# Altium footprint library MinervaBots.PcbLib: 162 footprints (part 8 of 11)
Each footprint in its own frame and in the unit in brackets; x right, y up, seen from the top. Pads: shape width x height; smd on the part's side, far side on the other; paste and mask are expansions set on the pad; w line width, h text height; cw(c..) or ccw(c..) is an arc to the next point about the centre after c.
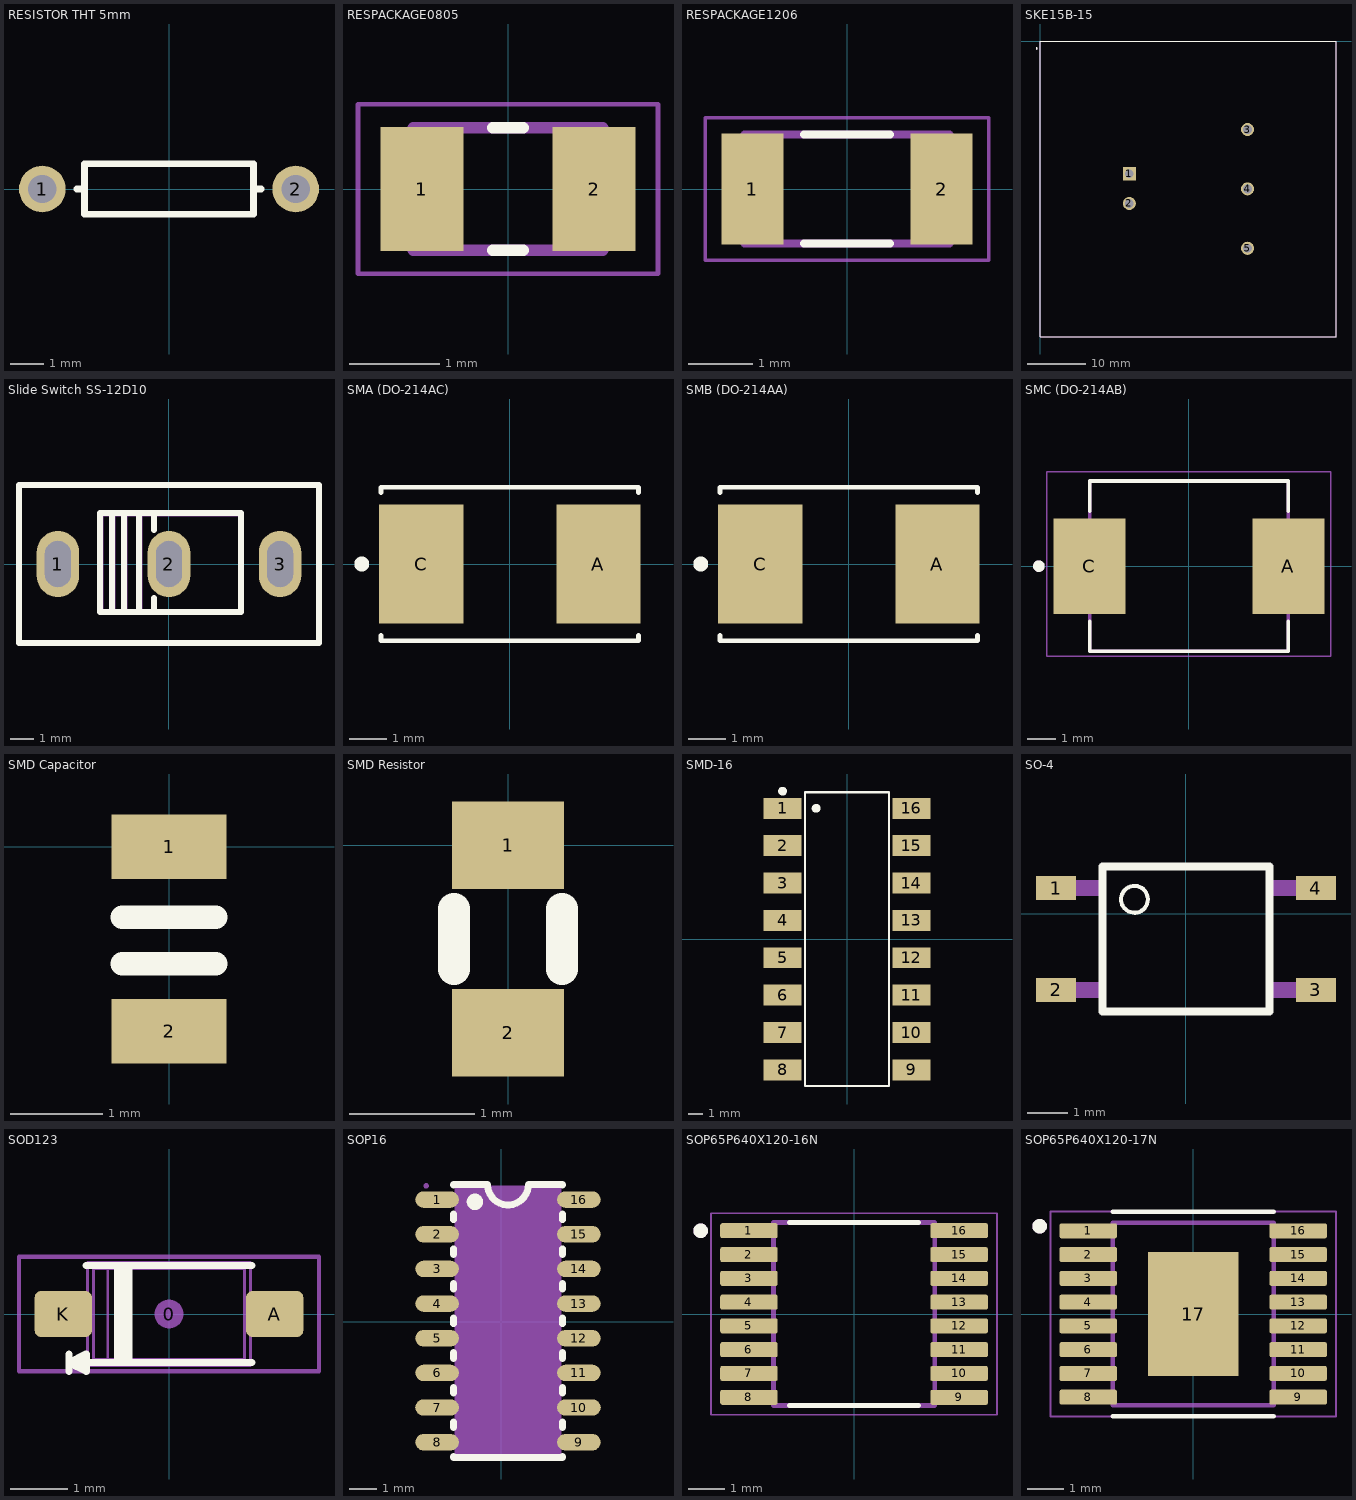
[diagram p7: the footprints below, top view; thin cyan lines are the x and y axes]

## RESISTOR THT 5mm [mm]
pads (2):
  round 1.4 hole 0.85: 1(-3.81,0) 2(3.81,0)
Top Overlay:
  lines w0.2: -2.769,0 -2.54,0 ; 2.769,0 2.54,0 ; 2.54,0 2.54,-0.762 -2.54,-0.762 -2.54,0.762 2.54,0.762 2.54,0
Top Designator:
  text ".Designator" at -7.618,-0.458 h1.52
3D body "Resistor 0.0125W 3mm.step": height 2.55, standoff -6, extent -4.07,-1 4.07,1.1

## RESPACKAGE0805 [mm]
pads (2):
  rect 0.92x1.38 smd: 1(-0.955,0) 2(0.955,0)
Top Overlay:
  lines w0.127: -0.17,-0.68 0.17,-0.68 ; -0.17,0.68 0.17,0.68
Top Designator:
  text ".Designator" at -7.618,-0.508 h1.52
Mechanical 13:
  lines w0.127: -1.05,-0.68 1.05,-0.68 1.05,0.68 -1.05,0.68 -1.05,-0.68
Mechanical 15:
  lines w0.05: -1.665,-0.94 1.665,-0.94 1.665,0.94 -1.665,0.94 -1.665,-0.94
3D body "1623119-1.STEP": height 0.6, standoff 0, extent -1,-0.625 1,0.625

## RESPACKAGE1206 [mm]
pads (2):
  rect 0.97x1.73 smd: 1(-1.48,0) 2(1.48,0)
Top Overlay:
  lines w0.127: -0.67,-0.85 0.67,-0.85 ; -0.67,0.85 0.67,0.85
Top Designator:
  text ".Designator" at -7.618,-0.508 h1.52
Mechanical 13:
  lines w0.127: -1.6,-0.85 -1.6,0.85 1.6,0.85 1.6,-0.85 -1.6,-0.85
Mechanical 15:
  lines w0.05: -2.215,-1.115 -2.215,1.115 2.215,1.115 2.215,-1.115 -2.215,-1.115

## SKE15B-15 [mm]
pads (5):
  rect 2.25x2.25 hole 1.5: 1(15.3,-22.8)
  round 2.25 hole 1.5: 2(15.3,-27.9) 3(35.6,-15.2) 4(35.6,-25.4) 5(35.6,-35.6)
Top Overlay:
  circle w0.2: c-0.635,-1.27 r0.1
  lines w0.127: 0,-50.8 50.8,-50.8 50.8,0 0,0 0,-50.8
Top Designator:
  text ".Designator" at 17.397,-25.924 h1.52
Mechanical 4:
  circle w0.2: c-0.635,-1.27 r0.1
  lines w0.127: 0,-50.831 0,0 50.8,0 50.8,-50.8 0,-50.8
Mechanical 16:
  lines w0.05: 0,-50.8 50.8,-50.8 50.8,0 0,0 0,-50.8
3D body: height 11, standoff 0, extent 0,-50.8 50.8,0

## Slide Switch SS-12D10 [mm]
pads (3):
  oval 1.8x2.8 hole 1.1 slot 1.95 at 90 deg: 1(-4.7,0) 2(0,0) 3(4.7,0)
Top Overlay:
  lines w0.254: -2.413,-1.905 -2.413,2.159 -2.286,2.159 ; -1.905,-2.032 -1.905,2.159 ; -1.397,2.159 -1.27,2.159 -1.27,-2.032 ; -0.762,2.159 -0.635,2.159 -0.635,1.436 ; -0.635,-2.025 -0.635,-1.436 ; -6.35,-3.35 -6.35,3.35 6.35,3.35 6.35,-3.35 -6.35,-3.35 ; -2.921,-2.032 -2.921,2.159 3.048,2.159 3.048,-2.032 -2.921,-2.032
Top Designator:
  text ".Designator" at -7.618,4.667 h1.52
Mechanical 15:
  region: -1.397,2.032 -1.143,2.032 -1.143,-1.905 -1.397,-1.905
  region: -2.032,2.032 -1.778,2.032 -1.778,-2.032 -2.032,-2.032 -2.032,-1.905
  region: -2.54,2.032 -2.286,2.032 -2.286,-1.905 -2.54,-1.905 -2.54,-1.778
  region: -2.921,2.159 -2.794,2.159 -2.794,-1.905 -2.921,-1.905
  region: -2.921,2.159 3.048,2.159 3.048,-2.032 -2.921,-2.032 -2.921,-1.905 2.921,-1.905 2.921,2.032 -2.921,2.032
3D body "ss-12d10l6.stp": height 12.4, standoff -6.9, extent -6.5,-3.4 6.5,3.4

## SMA (DO-214AC) [mm] "Diodo Schottky"
pads (2):
  rect 2.25x3.18 smd: A(2.365,0) C(-2.365,0)
Top Overlay:
  circle w0.2: c-3.95,0 r0.1
  lines w0.127: -3.437,-2.05 -1.719,-2.05 1.719,-2.05 3.437,-2.05 3.437,-1.91 ; -3.437,-2.025 -3.437,-1.91 ; -3.437,1.91 -3.437,2.05 -1.719,2.05 1.719,2.05 3.437,2.05 ; 3.437,1.91 3.437,2.025
Top Designator:
  text ".Designator" at -7.897,-0.508 h1.52
3D body "SMA.step": height 2.2, standoff 0, extent -2.598,-1.302 2.598,1.302

## SMB (DO-214AA) [mm] "Diodo Schottky"
pads (2):
  rect 2.25x3.18 smd: A(2.365,0) C(-2.365,0)
Top Overlay:
  circle w0.2: c-3.95,0 r0.1
  lines w0.127: -3.437,-2.05 -1.719,-2.05 1.719,-2.05 3.437,-2.05 3.437,-1.91 ; -3.437,-2.025 -3.437,-1.91 ; -3.437,1.91 -3.437,2.05 -1.719,2.05 1.719,2.05 3.437,2.05 ; 3.437,1.91 3.437,2.025
Top Designator:
  text ".Designator" at -7.897,-0.508 h1.52
3D body "SMB.step": height 2.2, standoff 0, extent -2.648,-1.81 2.648,1.81

## SMC (DO-214AB) [mm] "Diodo Schottky"
pads (2):
  rect 2.5x3.3 smd: A(3.45,0) C(-3.45,0)
Top Overlay:
  circle w0.2: c-5.2,0 r0.1
  lines w0.127: -3.433,-1.91 -3.433,-2.95 3.441,-2.95 3.441,-1.91 ; -3.433,1.91 -3.433,2.95 3.441,2.95 3.441,1.91
Top Designator:
  text ".Designator" at -7.843,-0.433 h1.52
Mechanical 13:
  circle w0.2: c-5.2,0 r0.1
  lines w0.127: -3.433,-2.95 -3.433,2.95 3.441,2.95 3.441,-2.95 -3.433,-2.95
Mechanical 15:
  lines w0.05: -4.925,-3.125 4.925,-3.125 4.925,3.275 -4.925,3.275 -4.925,-3.125
3D body "SS34.STEP": height 2.5, standoff 0, extent -3.95,-2.9 3.95,2.9

## SMD Capacitor [mm]
pads (2):
  rect 1.25x0.7 smd: 1(0,0) 2(0,-2)
Top Overlay:
  lines w0.254: -0.508,-1.27 0.508,-1.27 ; -0.508,-0.762 0.508,-0.762
Top Designator:
  text ".Designator" at -7.618,-1.508 h1.52
3D body "Capacitor SMD 0805.step": height 1, standoff 0, extent -0.625,-1.99 0.625,0.01

## SMD Resistor [mm]
pads (2):
  rect 0.9x0.7 smd: 1(0,0) 2(0,-1.5)
Top Overlay:
  lines w0.254: -0.432,-0.991 -0.432,-0.508 ; 0.432,-0.991 0.432,-0.508
Top Designator:
  text ".Designator" at -7.617,-1.258 h1.52
3D body "SMD Resistor CRS0805.step": height 0.5, standoff 0, extent -0.624,-1.743 0.626,0.257

## SMD-16 [mm]
pads (16):
  rect 2.6x1.422 smd: 1(-4.38,8.89) 2(-4.38,6.35) 3(-4.38,3.81) 4(-4.38,1.27) 5(-4.38,-1.27) 6(-4.38,-3.81) 7(-4.38,-6.35) 8(-4.38,-8.89) 9(4.38,-8.89) 10(4.38,-6.35) 11(4.38,-3.81) 12(4.38,-1.27) 13(4.38,1.27) 14(4.38,3.81) 15(4.38,6.35) 16(4.38,8.89)
Top Overlay:
  circle w0.3: c-4.38,10.054 r0.15
  circle w0.3: c-2.099,8.89 r0.15
  lines w0.152: -2.851,-9.986 -2.851,9.986 2.851,9.986 2.851,-9.986 -2.851,-9.986
Top Designator:
  text ".Designator" at -7.618,-0.362 h1.52
3D body "ILQ32-X009.STEP": height 4.06, standoff 0, extent -4.788,-9.96 4.992,9.96

## SO-4 [mm]
pads (4):
  rect 1x0.6 smd: 1(-3.24,0.635) 2(-3.24,-1.905) 3(3.24,-1.905) 4(3.24,0.635)
Top Overlay:
  circle w0.102: c-1.285,0.354 r0.335
  lines w0.203: -2.085,-2.438 -2.085,1.168 2.085,1.168 2.085,-2.438 -2.085,-2.438
Top Designator:
  text ".Designator" at -7.618,-1.143 h1.52
Mechanical 13:
  region: 3.471,0.445 2.153,0.445 2.153,0.826 3.471,0.826
  region: 3.471,-2.097 2.152,-2.097 2.152,-1.714 3.471,-1.714
  region: -2.15,-2.097 -3.474,-2.097 -3.474,-1.714 -2.15,-1.714
  region: -2.15,0.445 -3.476,0.445 -3.476,0.826 -2.15,0.826

## SOD123 [mm] "SOD-123; 2 Leads; Body 2.7 x 1.6 mm, (LxW)"
height 1.35
pads (3):
  round 0.508 on Mech15: 0(0,0)
  rrect25% 1x0.8 smd: A(1.85,0) K(-1.85,0)
Top Overlay:
  lines w0.127: -1.75,-1 -1.75,-0.7 ; -1.45,0.85 1.45,0.85 ; -0.9,-0.85 -0.9,0.85 ; -0.8,-0.85 -0.8,0.85 ; -0.7,-0.85 -0.7,0.85 ; 1.448,-0.85 -1.45,-0.85 -1.75,-0.85 ; -1.75,-0.85 -1.45,-1 -1.45,-0.7 -1.75,-0.85
Top Designator:
  text ".Designator" at -7.618,-0.521 h1.52
Mechanical 13:
  lines w0.05: -1.766,-0.308 -1.766,0.308 ; -1.707,-0.308 -1.707,0.308 ; -1.517,-0.308 -1.517,0.308 ; -1.425,-0.308 -1.95,-0.308 -1.95,0.308 -1.425,0.308 ; 1.425,-0.308 1.95,-0.308 1.95,0.308 1.425,0.308 ; 1.517,-0.308 1.517,0.308 ; 1.707,-0.308 1.707,0.308 ; 1.766,-0.308 1.766,0.308 ; -1.425,-0.9 1.425,-0.9 ; -1.425,-0.9 -1.323,-0.798 ; -1.425,-0.9 -1.425,0.9 ; -1.425,0.9 -1.323,0.798 ; -1.425,0.9 1.425,0.9 ; -1.323,-0.798 -1.072,-0.798 ; -1.323,-0.798 -1.323,0.798 ; -1.323,0.798 -1.072,0.798 ; -1.072,-0.798 1.322,-0.797 ; -1.072,-0.798 -1.072,0.798 ; -1.072,0.798 1.322,0.797 ; 1.322,-0.797 1.322,0.797 ; 1.322,-0.797 1.425,-0.9 ; 1.322,0.797 1.425,0.9 ; 1.425,-0.9 1.425,0.9
Mechanical 15:
  lines w0.076: -2.625,-1 2.625,-1 2.625,1 -2.625,1 -2.625,-1
3D body "SOD123.STEP": height 1.18, standoff 0, extent -1.95,-0.9 1.95,0.9

## SOP16 [mm]
pads (16):
  oval 1.6x0.6 smd: 1(-2.35,4.474) 2(-2.35,3.204) 3(-2.35,1.934) 4(-2.35,0.664) 5(-2.35,-0.606) 6(-2.35,-1.876) 7(-2.35,-3.146) 8(-2.35,-4.416) 9(2.851,-4.416) 10(2.851,-3.146) 11(2.851,-1.876) 12(2.851,-0.606) 13(2.851,0.664) 14(2.851,1.934) 15(2.851,3.204) 16(2.851,4.474)
Top Overlay:
  lines w0.254: -1.75,-4.947 -1.75,-4.971 2.25,-4.971 2.25,-4.947 ; -1.75,-3.885 -1.75,-3.677 ; -1.75,-2.615 -1.75,-2.407 ; -1.75,-1.345 -1.75,-1.137 ; -1.75,-0.075 -1.75,0.133 ; -1.75,1.195 -1.75,1.403 ; -1.75,2.465 -1.75,2.673 ; -1.75,3.735 -1.75,3.943 ; -1.75,5.005 -1.75,5.029 -0.5,5.029 ; -0.501,5.029 ccw(c0.25,5.029) 1.001,5.029 2.25,5.029 2.25,5.005 ; 2.25,-3.885 2.25,-3.677 ; 2.25,-2.615 2.25,-2.407 ; 2.25,-1.345 2.25,-1.137 ; 2.25,-0.075 2.25,0.133 ; 2.25,1.195 2.25,1.403 ; 2.25,2.465 2.25,2.673 ; 2.25,3.735 2.25,3.943
  lines w0.3: -0.813,4.392 cw(c-0.963,4.393) -0.813,4.394
Top Designator:
  text ".Designator" at -7.367,-0.479 h1.52
Mechanical 4:
  region: 2.201,4.979 2.201,-4.921 -1.699,-4.921 -1.699,4.979
Mechanical 5:
  region: 3.251,-4.633 2.461,-4.633 2.461,-4.198 3.251,-4.198
  pour cut-out: 2.471,-4.633 2.191,-4.633 2.191,-4.198 2.471,-4.198
  region: 3.251,-3.363 2.461,-3.363 2.461,-2.928 3.251,-2.928
  pour cut-out: 2.471,-3.363 2.191,-3.363 2.191,-2.928 2.471,-2.928
  region: 3.251,-2.093 2.461,-2.093 2.461,-1.658 3.251,-1.658
  pour cut-out: 2.471,-2.093 2.191,-2.093 2.191,-1.658 2.471,-1.658
  region: 3.251,-0.823 2.461,-0.823 2.461,-0.388 3.251,-0.388
  pour cut-out: 2.471,-0.823 2.191,-0.823 2.191,-0.388 2.471,-0.388
  region: 3.251,0.447 2.461,0.447 2.461,0.882 3.251,0.882
  pour cut-out: 2.471,0.447 2.191,0.447 2.191,0.882 2.471,0.882
  region: 3.251,1.717 2.461,1.717 2.461,2.152 3.251,2.152
  pour cut-out: 2.471,1.717 2.191,1.717 2.191,2.152 2.471,2.152
  region: 3.251,2.987 2.461,2.987 2.461,3.422 3.251,3.422
  pour cut-out: 2.471,2.987 2.191,2.987 2.191,3.422 2.471,3.422
  region: 3.251,4.257 2.461,4.257 2.461,4.692 3.251,4.692
  pour cut-out: 2.471,4.257 2.191,4.257 2.191,4.692 2.471,4.692
  region: -2.749,4.692 -1.959,4.692 -1.959,4.257 -2.749,4.257
  pour cut-out: -1.969,4.692 -1.689,4.692 -1.689,4.257 -1.969,4.257
  region: -2.749,3.422 -1.959,3.422 -1.959,2.987 -2.749,2.987
  pour cut-out: -1.969,3.422 -1.689,3.422 -1.689,2.987 -1.969,2.987
  region: -2.749,2.152 -1.959,2.152 -1.959,1.717 -2.749,1.717
  pour cut-out: -1.969,2.152 -1.689,2.152 -1.689,1.717 -1.969,1.717
  region: -2.749,0.882 -1.959,0.882 -1.959,0.447 -2.749,0.447
  pour cut-out: -1.969,0.882 -1.689,0.882 -1.689,0.447 -1.969,0.447
  region: -2.749,-0.388 -1.959,-0.388 -1.959,-0.823 -2.749,-0.823
  pour cut-out: -1.969,-0.388 -1.689,-0.388 -1.689,-0.823 -1.969,-0.823
  region: -2.749,-1.658 -1.959,-1.658 -1.959,-2.093 -2.749,-2.093
  pour cut-out: -1.969,-1.658 -1.689,-1.658 -1.689,-2.093 -1.969,-2.093
  region: -2.749,-2.928 -1.959,-2.928 -1.959,-3.363 -2.749,-3.363
  pour cut-out: -1.969,-2.928 -1.689,-2.928 -1.689,-3.363 -1.969,-3.363
  region: -2.749,-4.198 -1.959,-4.198 -1.959,-4.633 -2.749,-4.633
  pour cut-out: -1.969,-4.198 -1.689,-4.198 -1.689,-4.633 -1.969,-4.633
Mechanical 6:
  circle w0.1: c-2.75,4.979 r0.05
Mechanical 15:
  circle w0.2: c-2.569,4.55 r0.1
3D body "User Library-sop16-1.step": height 1.58, standoff 0, extent -2.914,-4.991 3.321,4.99

## SOP65P640X120-16N [mm]
pads (16):
  rrect25% 1.57x0.41 smd: 1(-2.87,2.275) 2(-2.87,1.625) 3(-2.87,0.975) 4(-2.87,0.325) 5(-2.87,-0.325) 6(-2.87,-0.975) 7(-2.87,-1.625) 8(-2.87,-2.275) 9(2.87,-2.275) 10(2.87,-1.625) 11(2.87,-0.975) 12(2.87,-0.325) 13(2.87,0.325) 14(2.87,0.975) 15(2.87,1.625) 16(2.87,2.275)
Top Overlay:
  circle w0.2: c-4.19,2.275 r0.1
  lines w0.127: -1.765,-2.5 1.765,-2.5 ; -1.765,2.5 1.765,2.5
Mechanical 13:
  circle w0.2: c-4.19,2.275 r0.1
  lines w0.127: -2.2,-2.5 2.2,-2.5 2.2,2.5 -2.2,2.5 -2.2,-2.5
Mechanical 15:
  lines w0.05: -3.905,-2.75 3.905,-2.75 3.905,2.75 -3.905,2.75 -3.905,-2.75
3D body "DRV8833PW.STEP": height 1.17, standoff -0.03, extent -3.05,-2.5 3.35,2.5

## SOP65P640X120-17N [mm]
pads (17):
  rrect25% 1.57x0.41 smd: 1(-2.87,2.275) 2(-2.87,1.625) 3(-2.87,0.975) 4(-2.87,0.325) 5(-2.87,-0.325) 6(-2.87,-0.975) 7(-2.87,-1.625) 8(-2.87,-2.275) 9(2.87,-2.275) 10(2.87,-1.625) 11(2.87,-0.975) 12(2.87,-0.325) 13(2.87,0.325) 14(2.87,0.975) 15(2.87,1.625) 16(2.87,2.275)
  rect 2.48x3.4 smd paste-3: 17(0,0)
Top Overlay:
  circle w0.2: c-4.2,2.4 r0.1
  lines w0.127: -2.2,-2.8 2.2,-2.8 ; -2.2,2.8 2.2,2.8
Top Paste:
  region: 0.8,-1.075 -0.8,-1.075 -0.8,1.075 0.8,1.075
Top Designator:
  text ".Designator" at -7.853,-0.508 h1.52
Mechanical 13:
  circle w0.2: c-4.2,2.4 r0.1
  lines w0.127: -2.2,-2.5 -2.2,2.5 2.2,2.5 2.2,-2.5 -2.2,-2.5
Mechanical 15:
  lines w0.05: -3.905,-2.8 -3.905,2.8 3.905,2.8 3.905,-2.8 -3.905,-2.8
3D body "DRV8874PWPR.STEP": height 1.2, standoff 0, extent -3.2,-2.5 3.2,2.5